# Altium footprint library User.PcbLib: 317 footprints (part 17 of 20)
Each footprint in its own frame and in the unit in brackets; x right, y up, seen from the top. Pads: shape width x height; smd on the part's side, far side on the other; paste and mask are expansions set on the pad; w line width, h text height; cw(c..) or ccw(c..) is an arc to the next point about the centre after c.
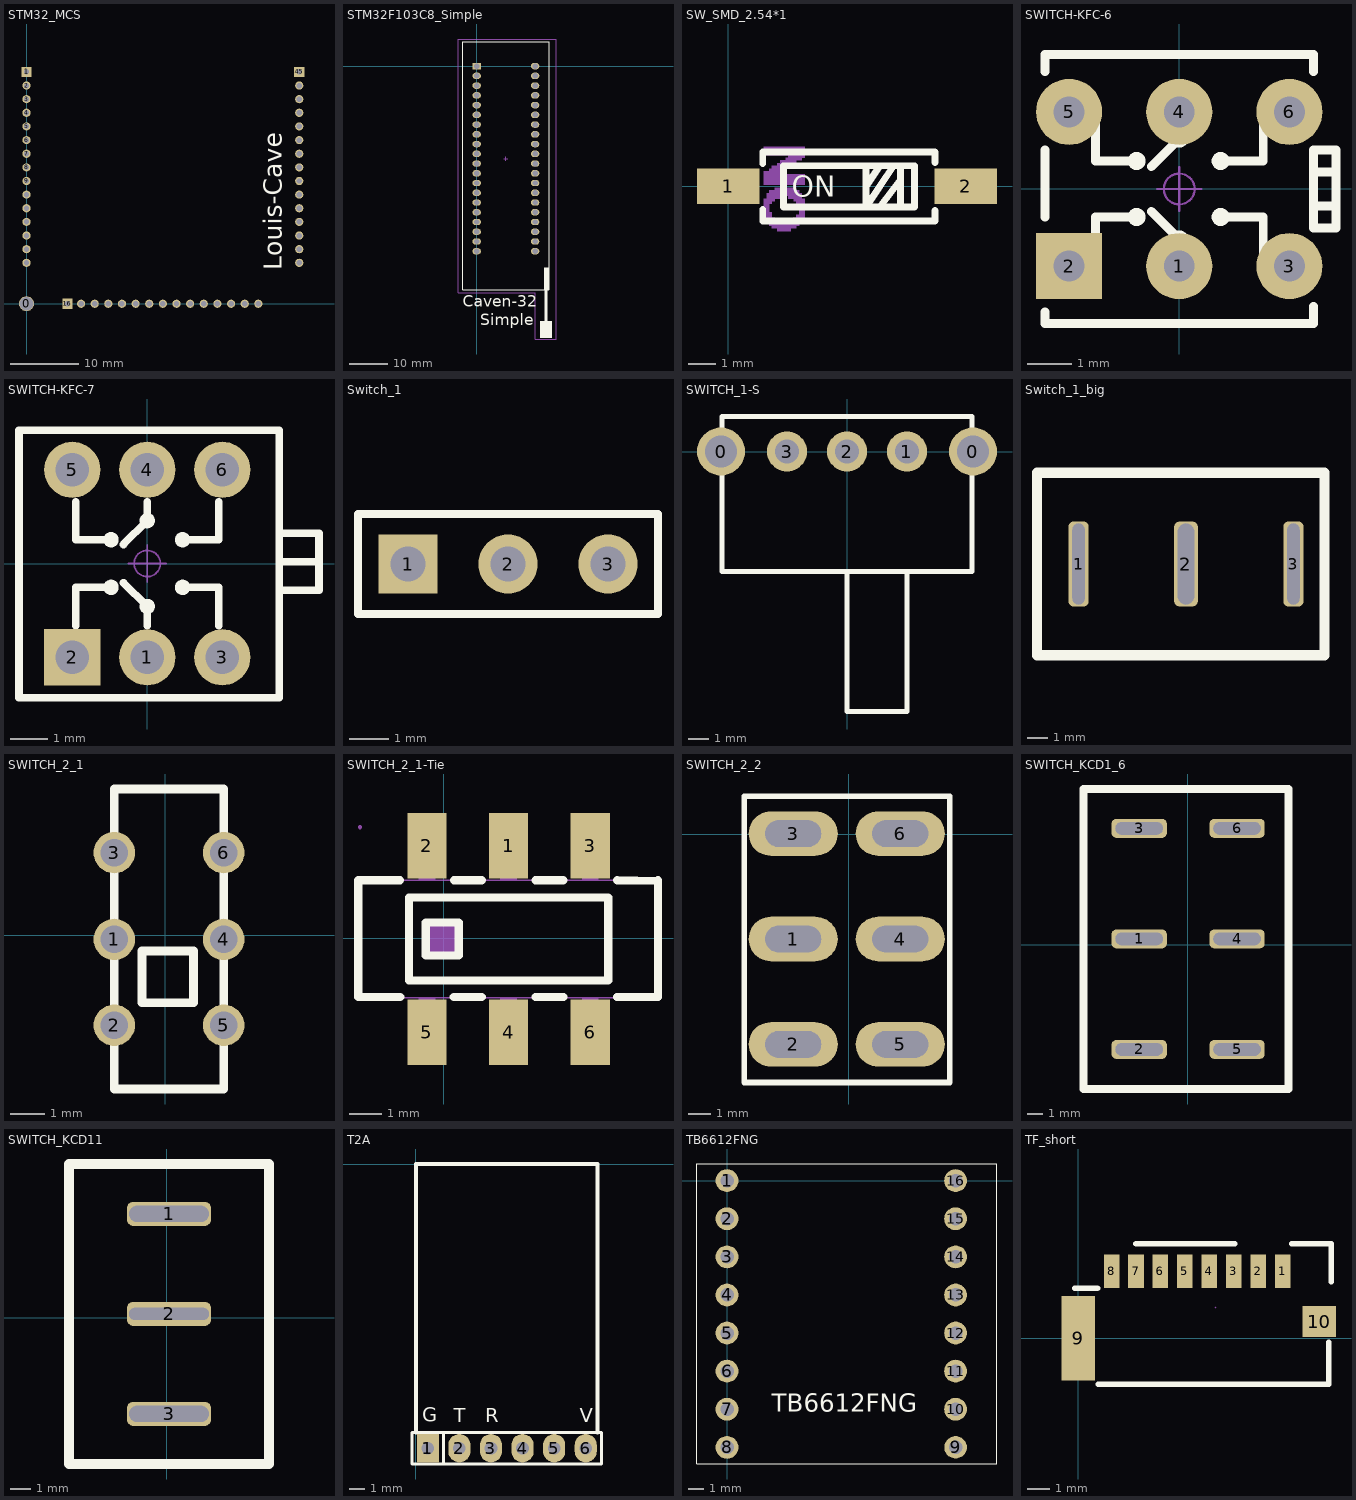
[diagram p16: the footprints below, top view; thin cyan lines are the x and y axes]

## STM32_MCS [mm] "MCU"
pads (46):
  round 2.2 hole 2: 0(0,0)
  rect 1.5x1.5 hole 0.8: 1(0,34) 16(6,0) 45(40,34)
  round 1.2 hole 0.8: 2(0,32) 3(0,30) 4(0,28) 5(0,26) 6(0,24) 7(0,22) 8(0,20) 9(0,18) 10(0,16) 11(0,14) 12(0,12) 13(0,10) 14(0,8) 15(0,6) 17(8,0) 18(10,0) 19(12,0) 20(14,0) 21(16,0) 22(18,0) 23(20,0) 24(22,0) 25(24,0) 26(26,0) 27(28,0) 28(30,0) 29(32,0) 30(34,0) 31(40,6) 32(40,8) 33(40,10) 34(40,12) 35(40,14) 36(40,16) 37(40,18) 38(40,20) 39(40,22) 40(40,24) 41(40,26) 42(40,28) 43(40,30) 44(40,32)
Top Overlay:
  text "Louis-Cave" at 38.324,4.902 h4.57
Top Solder:
  text "V1.2" at 24.867,38.675 h2.54
3D body "HEADER-FPC-ZIF-SMD-Horizontal-0.5-24.stp": height -4.3, standoff -6.55, extent 9.45,26.9 25.55,33.399
3D body "User Library-0603 SMD Capacitor.STEP": height 6.8, standoff 6.5, extent 4.475,34.018 6.076,34.818
3D body "User Library-0603 SMD Capacitor.STEP": height -6.2, standoff -6.5, extent 26.228,23.077 27.828,23.877
3D body "CAP-B.STEP": height 8.4, standoff 6.5, extent 31.346,38.097 34.846,40.897
3D body "User Library-0603 SMD Capacitor.STEP": height -6.2, standoff -6.5, extent 22.182,38.816 22.982,40.416
3D body "User Library-0603 SMD Capacitor.STEP": height 6.8, standoff 6.5, extent 32.664,36.349 34.264,37.149
3D body "User Library-0603 SMD Capacitor.STEP": height -6.2, standoff -6.5, extent 13.127,40.14 14.727,40.94
3D body "User Library-0603 SMD Capacitor.STEP": height -6.2, standoff -6.5, extent 27.756,6.899 29.356,7.699
3D body "User Library-0603 SMD Capacitor.STEP": height -6.2, standoff -6.5, extent 27.756,4.099 29.356,4.899
3D body "User Library-0603 SMD Capacitor.STEP": height -6.2, standoff -6.5, extent 22.75,2.319 23.55,3.919
3D body "User Library-0603 SMD Capacitor.STEP": height -6.2, standoff -6.5, extent 26.243,25.481 27.843,26.281
3D body "User Library-0603 SMD Capacitor.STEP": height -6.2, standoff -6.5, extent 19.45,2.319 20.25,3.919
3D body "User Library-0603 SMD Capacitor.STEP": height -6.2, standoff -6.5, extent 32.415,9.622 33.215,11.222
3D body "User Library-0603 SMD Capacitor.STEP": height -6.2, standoff -6.5, extent 3.348,4.427 4.948,5.227
3D body "User Library-0603 SMD Capacitor.STEP": height -6.2, standoff -6.5, extent 7.6,18.928 9.2,19.728
3D body "User Library-0603 SMD Capacitor.STEP": height -6.2, standoff -6.5, extent 36.965,4.361 37.765,5.961
3D body "DO-214AC.STEP": height 8.9, standoff 6.5, extent 35.658,29.247 38.358,33.847
3D body "SW.STEP": height 8.5, standoff 6.4, extent 28.362,1.527 33.32,4.527
3D body "SW.STEP": height 8.5, standoff 6.4, extent 7.696,1.473 12.654,4.473
3D body "LED0603(R).STEP": height 7.1, standoff 6.5, extent 36.44,36.35 38.06,37.15
3D body "LQFP-64-10x10.STEP": height -4.88, standoff -6.51, extent 13.928,9.58 26.072,21.723
3D body "XH2.54-WS-4P.STEP": height -0.45, standoff -6.51, extent 24.673,30.922 39.673,41.341
3D body "HDR2.0-LI-15P.STEP": height 0, standoff -9.3, extent 5,-1 35,1
3D body "HDR2.0-LI-15P.STEP": height 0, standoff -9.3, extent 39,5 41,35
3D body "HDR2.0-LI-15P.STEP": height 0, standoff -9.3, extent -1,5 1,35
3D body "RESC1608(0603).STEP": height -6.12, standoff -6.5, extent 6.814,29.794 7.614,31.394
3D body "RESC1608(0603).STEP": height -6.12, standoff -6.5, extent 5.264,29.799 6.064,31.399
3D body "RESC1608(0603).STEP": height -6.12, standoff -6.5, extent 3.715,29.799 4.515,31.399
3D body "RESC1608(0603).STEP": height -6.12, standoff -6.5, extent 13.145,38.411 14.745,39.211
3D body "RESC1608(0603).STEP": height -6.12, standoff -6.5, extent 34.347,9.715 35.147,11.316
3D body "RESC1608(0603).STEP": height -6.12, standoff -6.5, extent 3.47,2.6 5.07,3.4
3D body "RESC1608(0603).STEP": height -6.12, standoff -6.5, extent 36.964,0.775 37.763,2.375
3D body "SOT23-5R.STEP": height 7.8, standoff 6.5, extent 36.93,37.94 39.93,40.94
3D body "XTAL ABS07.STEP": height -5.59, standoff -6.5, extent 25.04,4.29 26.56,7.51
3D body "OSC 3225-4.STEP": height -5.8, standoff -6.52, extent 19.898,5.265 23.098,7.765
3D body "RESC1608(0603).STEP": height -6.12, standoff -6.5, extent 39.961,0.826 40.761,2.426
3D body "TSW SMD-3x6x2.5.STEP": height 9.09, standoff 6.47, extent 16.519,1.095 24.519,4.595
3D body "usbt_H0_48-L8_3.STEP": height -4.73, standoff -7.89, extent -0.148,35.164 11.252,43.464
3D body "RESC1608(0603).STEP": height 6.88, standoff 6.5, extent 39.6,35.45 40.4,37.05
3D body "RESC1608(0603).STEP": height 6.88, standoff 6.5, extent 5.823,13.17 6.623,14.77
3D body "SOD123.STEP": height -5.23, standoff -6.5, extent 16.895,38.951 20.595,40.551
3D body: height 7.5, standoff 7, extent 8.313,7.5 33,32.775
3D body: height 7.2, standoff 7, extent 7.325,6.525 33.95,38.525
3D body: height 6.3, standoff 6.2, extent -2,-2 42,42

## STM32F103C8_Simple [mm]
pads (40):
  rect 2.2x1.66 hole 1.4: 1(0,0)
  oval 2.2x1.66 hole 1.4: 2(0,-2.54) 3(0,-5.08) 4(0,-7.62) 5(0,-10.16) 6(0,-12.7) 7(0,-15.24) 8(0,-17.78) 9(0,-20.32) 10(0,-22.86) 11(0,-25.4) 12(0,-27.94) 13(0,-30.48) 14(0,-33.02) 15(0,-35.56) 16(0,-38.1) 17(0,-40.64) 18(0,-43.18) 19(0,-45.72) 20(0,-48.26) 21(15.24,-48.26) 22(15.24,-45.72) 23(15.24,-43.18) 24(15.24,-40.64) 25(15.24,-38.1) 26(15.24,-35.56) 27(15.24,-33.02) 28(15.24,-30.48) 29(15.24,-27.94) 30(15.24,-25.4) 31(15.24,-22.86) 32(15.24,-20.32) 33(15.24,-17.78) 34(15.24,-15.24) 35(15.24,-12.7) 36(15.24,-10.16) 37(15.24,-7.62) 38(15.24,-5.08) 39(15.24,-2.54) 40(15.24,0)
Top Overlay:
  region: 17.569,-52.508 17.569,-58.308 18.869,-58.308 18.869,-52.508
  region: 16.469,-66.408 16.469,-70.808 19.669,-70.808 19.669,-66.408
  lines w0.254: 18.844,-58.355 -3.58,-58.355 -3.58,6.292 18.869,6.292 18.869,-58.33
  lines w0.8: 18.069,-68.308 18.069,-58.355
  text "Caven-32" at -3.575,-63.819 h5
  text "Simple" at 0.944,-68.53 h5
Mechanical 15:
  lines w0.1: 7.12,-24.13 8.12,-24.13 ; 7.62,-24.63 7.62,-23.63 ; -4.78,-59.03 15.22,-59.03 15.22,-71.13 20.72,-71.13 20.72,7.07 -4.78,7.07 -4.78,-59.03
3D body "ZIF-40.STEP": height 12, standoff -4, extent -3.964,-70.899 19.902,6.292
3D body "HEADER 2.54X20.stp": height -7.8, standoff -19, extent -1.249,-49.657 1.249,1.143
3D body "stm32.step": height 25.5, standoff 13, extent -3.81,-50.875 19.05,3.885
3D body "HEADER 2.54X20.stp": height -7.8, standoff -19, extent 13.991,-49.657 16.489,1.143

## SW_SMD_2.54*1 [mm]
pads (2):
  rect 2.3x1.3 smd: 1(0,0) 2(8.75,0)
Top Overlay:
  lines w0.254: 1.27,-0.847 1.27,-1.27 7.62,-1.27 7.62,-0.881 ; 1.27,0.847 1.27,1.27 7.62,1.27 7.62,0.881 ; 5.08,0 5.588,0.762 ; 5.08,0.762 5.08,-0.762 6.096,0.762 ; 5.588,-0.762 6.35,0.254 ; 6.35,-0.762 6.35,0.762 ; 2.032,-0.762 2.032,0.762 6.858,0.762 6.858,-0.762 2.032,-0.762
  text "ON" at 2.343,-0.381 h0.76
Mechanical 15:
  drawing of 60 lines, arcs and shapes, not listed
3D body "3D_PCB-sw_2021-12-22.step": height 3.95, standoff 0.1, extent -0.204,-1.27 9.095,1.27

## SWITCH-KFC-6 [mm] "自锁开关，规格：6*6*12.5mm"
pads (6):
  round 1.5 hole 0.7: 1(0,-1.75) 3(2.5,-1.75) 4(0,1.75) 5(-2.5,1.75) 6(2.5,1.75)
  rect 1.5x1.5 hole 0.7: 2(-2.5,-1.75)
Top Overlay:
  circle w0.254: c0.94,-0.635 r0.076
  circle w0.254: c-0.965,-0.635 r0.076
  circle w0.254: c0,-1.143 r0.076
  circle w0.254: c0,1.143 r0.076
  circle w0.254: c-0.965,0.635 r0.076
  circle w0.254: c0.94,0.635 r0.076
  lines w0.203: -3.048,-2.794 -3.048,-3.048 3.048,-3.048 3.048,-2.667 ; -3.048,-0.635 -3.048,0.889 ; -3.048,2.667 -3.048,3.048 3.048,3.048 3.048,2.667 ; -1.905,-1.651 -1.905,-0.635 -0.889,-0.635 ; -1.905,1.651 -1.905,0.635 -0.889,0.635 ; -0.635,-0.508 0,-1.143 0,-1.651 ; -0.635,0.508 0,1.143 0,1.651 ; 1.016,-0.635 1.905,-0.635 1.905,-1.651 ; 1.016,0.635 1.905,0.635 1.905,1.651 ; 3.048,-0.381 3.556,-0.381 ; 3.048,0.381 3.556,0.381 ; 3.048,-0.889 3.556,-0.889 3.556,0.889 3.429,0.889 3.048,0.889 3.048,-0.889
Mechanical 15:
  circle w0.05: c0,0 r0.35
  lines w0.05: -0.5,0 0.5,0 ; 0,-0.5 0,0.5
3D body "KFC-6X6.STEP": height 12.5, standoff -3.5, extent -3,-3 3.5,3

## SWITCH-KFC-7 [mm] "自锁开关，规格：7*7mm"
pads (6):
  round 1.5 hole 0.9: 1(0,-2.5) 3(2,-2.5) 4(0,2.5) 5(-2,2.5) 6(2,2.5)
  rect 1.5x1.5 hole 0.9: 2(-2,-2.5)
Top Overlay:
  circle w0.254: c0.94,0.635 r0.076
  circle w0.254: c-0.965,0.635 r0.076
  circle w0.254: c0,1.143 r0.076
  circle w0.254: c0,-1.143 r0.076
  circle w0.254: c-0.965,-0.635 r0.076
  circle w0.254: c0.94,-0.635 r0.076
  lines w0.203: -1.905,-1.651 -1.905,-0.635 -0.889,-0.635 ; -1.905,1.651 -1.905,0.635 -0.889,0.635 ; -0.635,-0.508 0,-1.143 0,-1.651 ; -0.635,0.508 0,1.143 0,1.651 ; 1.016,-0.635 1.905,-0.635 1.905,-1.651 ; 1.016,0.635 1.905,0.635 1.905,1.651 ; 3.514,0.05 4.579,0.05 ; 3.563,-0.712 4.579,-0.712 4.579,0.812 3.563,0.812 ; -3.42,-3.581 -3.42,3.556 3.514,3.556 3.514,2.54 3.514,-3.581 -3.42,-3.581
Mechanical 15:
  circle w0.05: c0,0 r0.35
  lines w0.05: -0.5,0 0.5,0 ; 0,-0.5 0,0.5
3D body "SLSW 7x7.STEP": height 11.2, standoff -3.2, extent -3.5,-3.5 3.5,3.5

## Switch_1 [mm]
pads (3):
  rect 1.5x1.5 hole 0.9: 1(15.27,-17.819)
  round 1.5 hole 0.9: 2(17.81,-17.819) 3(20.35,-17.819)
Top Overlay:
  lines w0.2: 14,-19.089 14,-16.549 21.62,-16.549 21.62,-19.089 14,-19.089

## SWITCH_1-S [mm]
pads (5):
  round 2.4 hole 1.6: 0(-6.3,0) 0(6.3,0)
  round 2 hole 1.2: 1(3,0) 2(0,0) 3(-3,0)
Top Overlay:
  lines w0.254: 0,-6 0,-13 3,-13 3,-6 ; -6.25,-6 6.25,-6 6.25,0 6.25,1.5 6.25,1.75 -6.25,1.75 -6.25,0 -6.25,-6
Mechanical 15:
  circle w0.05: c0,0 r0.35
  lines w0.05: -0.5,0 0.5,0 ; 0,-0.5 0,0.5
3D body "User Library-SLIDE SWITCH SS12F23.STEP": height 5.75, standoff -3.35, extent -6.523,-12.292 6.477,0.608

## Switch_1_big [mm]
pads (3):
  rrect50% 1x4.2 hole 4 slot 0.6 at 0 deg: 1(-294.05,235.5) 3(-283.45,235.5)
  rrect50% 1.2x4.2 hole 4 slot 0.8 at 0 deg: 2(-288.75,235.5)
Top Overlay:
  lines w0.5: -296.1,231 -281.915,231 -281.915,240 -296.1,240 -296.1,231

## SWITCH_2_1 [mm]
pads (6):
  round 1.2 hole 0.8: 1(-1.475,-0.115) 2(-1.475,-2.604) 3(-1.475,2.4) 4(1.7,-0.115) 5(1.7,-2.604) 6(1.7,2.4)
Top Overlay:
  lines w0.254: -1.475,-4.453 1.7,-4.453 1.7,4.247 -1.475,4.247 -1.475,-4.453 ; -0.674,-1.953 0.826,-1.953 0.826,-0.453 -0.674,-0.453 -0.674,-1.953
3D body "CK_Slide (2).STEP": height 5.5, standoff -2.95, extent -1.675,-4.64 1.925,4.36

## SWITCH_2_1-Tie [mil]
pads (6):
  rect 47.2x78.7 smd mask+2: 1(78.25,111.5) 2(-20.15,111.5) 3(176.65,111.5) 4(78.25,-112.9) 5(-20.15,-112.9) 6(176.65,-112.9)
Top Overlay:
  lines w10: -52.65,70.2 -102.85,70.2 -102.85,-70.7 -52.45,-70.7 ; 12.05,-70.7 45.95,-70.7 ; 12.35,70.2 45.75,70.2 ; 110.55,-70.7 144.45,-70.7 ; 110.75,70.2 144.15,70.2 ; 208.95,-70.7 258.25,-70.7 258.25,70.2 ; 209.15,70.2 258.25,69.3 ; -41.75,-50.7 198.25,-50.7 198.25,49.3 -41.75,49.3 -41.75,-50.7 ; -21.75,-20.7 18.25,-20.7 18.25,19.3 -21.75,19.3 -21.75,-20.7
Mechanical 6:
  region: -21.75,19.3 18.25,19.3 18.25,-20.7 -21.75,-20.7
Mechanical 15:
  region: 68.45,-135.5 68.45,-104 88.05,-104 88.05,-135.5
  region: 68.45,-104.4 68.45,-71.2 88.05,-71.2 88.05,-104.4
  region: 166.85,-135.5 166.85,-104 186.55,-104 186.55,-135.5
  region: 166.85,-104.4 166.85,-71.2 186.55,-71.2 186.55,-104.4
  region: -30.05,102.6 -30.05,134.1 -10.35,134.1 -10.35,102.6
  region: -30.05,69.8 -30.05,103 -10.35,103 -10.35,69.8
  region: 68.45,102.6 68.45,134.1 88.05,134.1 88.05,102.6
  region: 68.45,69.8 68.45,103 88.05,103 88.05,69.8
  region: 166.85,102.6 166.85,134.1 186.55,134.1 186.55,102.6
  region: 166.85,69.8 166.85,103 186.55,103 186.55,69.8
  region: -30.05,-135.5 -30.05,-104 -10.35,-104 -10.35,-135.5
  region: -30.05,-104.4 -30.05,-71.2 -10.35,-71.2 -10.35,-104.4
  region: -98.45,134.1 -98.45,135.09 -99.86,136.5 -101.84,136.5 -103.25,135.09 -103.25,134.1 -103.25,133.11 -101.84,131.7 -99.86,131.7 -98.45,133.11
  lines w2: -100.85,-71.6 257.35,-71.6 257.35,70.2 -100.85,70.2 -100.85,-71.6
3D body "3D_PCBԪ_2021-12-22.step": height 218.49, standoff 3.94, extent -98.85,-135.53 255.45,134.13

## SWITCH_2_2 [mm]
pads (6):
  oval 4x2 hole 1.2 slot 2.5 at 0 deg: 1(-2.5,-4.699) 2(-2.5,-9.424) 3(-2.5,0.025) 4(2.3,-4.699) 5(2.3,-9.424) 6(2.3,0.025)
Top Overlay:
  lines w0.254: -4.7,-11.132 -4.7,1.695 4.525,1.695 4.525,-11.132 -4.7,-11.132
3D body "7101SYZBE CK switch.step": height 28.55, standoff -3.83, extent -3.531,-11.037 3.329,1.676

## SWITCH_KCD1_6 [mm] "6p"
pads (6):
  rrect50% 3.5x1.2 hole 3 slot 0.8 at 90 deg: 1(-3.076,0.356) 2(-3.076,-6.644) 3(-3.076,7.356) 4(3.124,0.356) 5(3.124,-6.644) 6(3.124,7.356)
Top Overlay:
  lines w0.5: -6.611,-9.152 6.389,-9.152 6.389,9.848 -6.611,9.848 -6.611,-9.152

## SWITCH_KCD11 [mm]
pads (3):
  rrect50% 4.2x1.2 hole 4 slot 0.8 at 90 deg: 1(0.115,5.203) 3(0.115,-4.797)
  rrect50% 4.2x1.2 hole 4 slot 0.6 at 90 deg: 2(0.115,0.203)
Top Overlay:
  lines w0.5: -4.885,-7.302 5.115,-7.302 5.115,7.698 -4.885,7.698 -4.885,-7.302

## T2A [mm]
pads (6):
  rect 1.4x1.8 hole 0.8: 1(0.75,-18)
  oval 1.4x1.8 hole 0.8: 2(2.75,-18) 3(4.75,-18) 4(6.75,-18) 5(8.75,-18) 6(10.75,-18)
Top Overlay:
  lines w0.2: 1.75,-19 1.75,-17 ; -0.25,-19 -0.25,-17 11.75,-17 11.75,-19 -0.25,-19
  lines w0.254: 0,-17 0,0 11.5,0 11.5,-17
  text "G" at 0.381,-16.648 h1.52
  text "V" at 10.381,-16.661 h1.52
  text "T" at 2.381,-16.661 h1.52
  text "R" at 4.382,-16.661 h1.52
3D body "HDR2.0-M-LI-6P.STEP": height 5.5, standoff -2.27, extent -0.25,-19 11.75,-17

## TB6612FNG [mil] "MODE"
pads (16):
  round 60 hole 35.43: 1(0,0) 2(0,-100) 3(0,-200) 4(0,-300) 5(0,-400) 6(0,-500) 7(0,-600) 8(0,-700) 10(600,-600) 11(600,-500) 12(600,-400) 13(600,-300) 14(600,-200) 15(600,-100) 16(600,0)
  round 59.06 hole 35.43: 9(600,-700)
Top Overlay:
  lines w3.15: -78.74,-743.74 -78.74,43.66 708.66,43.66 708.66,-743.74 -78.74,-743.74
  text "TB6612FNG" at 117,-622.59 h80
3D body: height 472.44, standoff 433.07, extent -78,-747 712,43
3D body "SSOP-24.STEP": height 547.24, standoff 472.44, extent 145.46,-511.42 452.55,-188.59
3D body "Capacitor 1206 SMD1.step": height 511.89, standoff 472.44, extent 236.02,-128.49 362,-65.5
3D body "HEADER 2.54X8.stp": height -149.61, standoff -590.55, extent -50,-755 48.37,44.99
3D body "HEADER 2.54X8.stp": height -149.61, standoff -590.55, extent 550,-755 648.37,44.99
3D body "Header-F-2.54X8.stp": height 338.58, standoff -122.05, extent -50.42,-754.92 48.01,54.92
3D body "Header-F-2.54X8.stp": height 338.58, standoff -122.05, extent 550.39,-754.92 648.82,54.92

## TF_short [mm]
pads (10):
  rect 0.7x1.5 smd: 1(9.2,3.008) 2(8.1,3.008) 3(7,3.008) 4(5.9,3.008) 5(4.8,3.008) 6(3.7,3.008) 7(2.6,3.008) 8(1.5,3.008)
  rect 1.5x3.8 smd: 9(0,0)
  rect 1.5x1.4 smd: 10(10.85,0.75)
Top Overlay:
  lines w0.254: -0.151,2.246 0.865,2.246 ; 0.903,-2.072 11.279,-2.072 11.279,-0.181 ; 2.6,4.25 7.045,4.25 ; 9.611,4.25 11.389,4.25 11.389,2.542
Mechanical 15:
  lines w0.003: 6.16,1.36 6.21,1.41
3D body "User Library-TF-021B.STEP": height 2.65, standoff 0, extent -0.07,-2.072 11.33,3.428